# Altium footprint library Reflow3D1411sep.PcbLib: 657 footprints (part 11 of 42)
Each footprint in its own frame and in the unit in brackets; x right, y up, seen from the top. Pads: shape width x height; smd on the part's side, far side on the other; paste and mask are expansions set on the pad; w line width, h text height; cw(c..) or ccw(c..) is an arc to the next point about the centre after c.
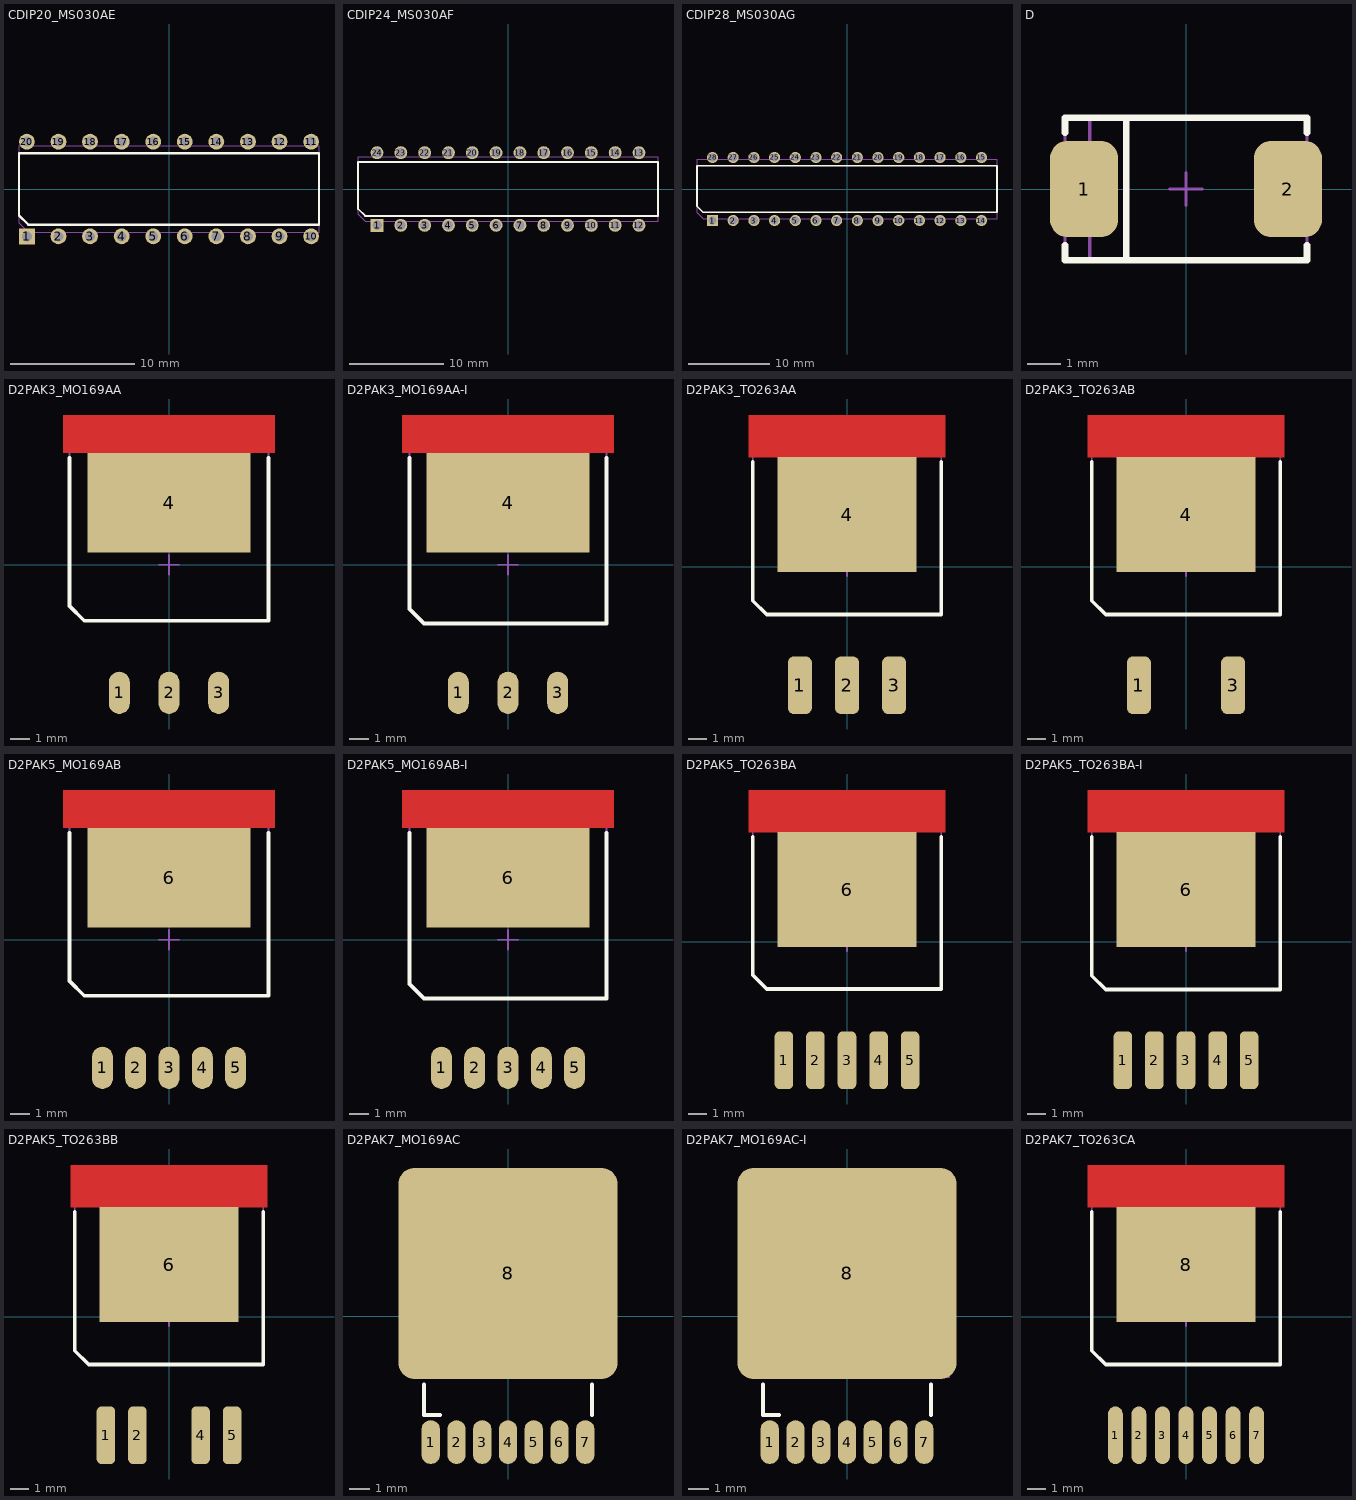
[diagram p10: the footprints below, top view; thin cyan lines are the x and y axes]

## CDIP20_MS030AE [mil] "www.ti.com, mcer002d.pdf, J20.asc"
height 177.56
pads (20):
  rect 50x50 hole 31: 1(-450,-150)
  round 50 hole 31: 2(-350,-150) 3(-250,-150) 4(-150,-150) 5(-50,-150) 6(50,-150) 7(150,-150) 8(250,-150) 9(350,-150) 10(450,-150) 11(450,150) 12(350,150) 13(250,150) 14(150,150) 15(50,150) 16(-50,150) 17(-150,150) 18(-250,150) 19(-350,150) 20(-450,150)
Top Overlay:
  lines w7.87: -475,-83.66 -445.47,-113.19 475,-113.19 475,113.19 -475,113.19 -475,-83.66
Mechanical 13:
  lines w3.94: -475,-106.69 -445.47,-136.22 475,-136.22 475,136.22 -475,136.22 -475,-106.69
3D body: height 200, standoff 0, extent -529.92,-150 529.92,150

## CDIP24_MS030AF [mm] "www.ti.com, mcer004a.pdf, JT24.asc"
height 4.51
pads (24):
  rect 1.37x1.37 hole 1.016: 1(-13.97,-3.875)
  round 1.37 hole 1.016: 2(-11.43,-3.875) 3(-8.89,-3.875) 4(-6.35,-3.875) 5(-3.81,-3.875) 6(-1.27,-3.875) 7(1.27,-3.875) 8(3.81,-3.875) 9(6.35,-3.875) 10(8.89,-3.875) 11(11.43,-3.875) 12(13.97,-3.875) 13(13.97,3.875) 14(11.43,3.875) 15(8.89,3.875) 16(6.35,3.875) 17(3.81,3.875) 18(1.27,3.875) 19(-1.27,3.875) 20(-3.81,3.875) 21(-6.35,3.875) 22(-8.89,3.875) 23(-11.43,3.875) 24(-13.97,3.875)
Top Overlay:
  lines w0.2: -16,-2.125 -15.25,-2.875 16,-2.875 16,2.875 -16,2.875 -16,-2.125
Mechanical 13:
  lines w0.1: -16,-2.71 -15.25,-3.46 16,-3.46 16,3.46 -16,3.46 -16,-2.71
3D body: height 5.08, standoff 0, extent -16.26,-3.81 16.26,3.81

## CDIP28_MS030AG [mm] "www.ti.com, mcer004a.pdf, JT28.asc"
height 4.51
pads (28):
  rect 1.37x1.37 hole 1.016: 1(-16.51,-3.875)
  round 1.37 hole 1.016: 2(-13.97,-3.875) 3(-11.43,-3.875) 4(-8.89,-3.875) 5(-6.35,-3.875) 6(-3.81,-3.875) 7(-1.27,-3.875) 8(1.27,-3.875) 9(3.81,-3.875) 10(6.35,-3.875) 11(8.89,-3.875) 12(11.43,-3.875) 13(13.97,-3.875) 14(16.51,-3.875) 15(16.51,3.875) 16(13.97,3.875) 17(11.43,3.875) 18(8.89,3.875) 19(6.35,3.875) 20(3.81,3.875) 21(1.27,3.875) 22(-1.27,3.875) 23(-3.81,3.875) 24(-6.35,3.875) 25(-8.89,3.875) 26(-11.43,3.875) 27(-13.97,3.875) 28(-16.51,3.875)
Top Overlay:
  lines w0.2: -18.415,-2.125 -18.415,2.875 18.415,2.875 18.415,-2.875 -17.665,-2.875 -18.415,-2.125
Mechanical 13:
  lines w0.1: -18.415,-2.91 -18.415,3.66 18.415,3.66 18.415,-3.66 -17.665,-3.66 -18.415,-2.91
3D body: height 5.08, standoff 0, extent -18.54,-3.695 18.54,3.695

## D [mm] "www.nec-tokin.com, capacitors.pdf"
height 2.8
pads (2):
  rrect50% 2.05x2.9 smd mask+0.075: 1(-3.075,0) 2(3.075,0)
Top Overlay:
  lines w0.2: -3.65,-1.7 -3.65,-2.15 3.65,-2.15 3.65,-1.7 ; -3.65,1.7 -3.65,2.15 3.65,2.15 3.65,1.7 ; -1.8,-2.15 -1.8,2.15
Mechanical 13:
  lines w0.1: -2.9,-2.15 -2.9,2.15 ; -3.65,-2.15 3.65,-2.15 3.65,2.15 -3.65,2.15 -3.65,-2.15
Mechanical 15:
  lines w0.1: -0.5,0 0.5,0 ; 0,-0.5 0,0.5
3D body: height 3, standoff 0, extent -3.75,-2.25 3.75,2.25

## D2PAK3_MO169AA [mm] "www.national.com, ts3b.pdf, AN-1797.pdf"
height 4.57
pads (4):
  oval 1.07x2.16 smd mask+0.075: 1(-2.54,-6.545) 2(0,-6.545) 3(2.54,-6.545)
  rect 8.33x5.08 smd paste-25.4 mask-25.4: 4(0,3.175)
Top Layer:
  region: -5.4,5.715 5.4,5.715 5.4,7.625 -5.4,7.625
Top Overlay:
  lines w0.2: -5.08,5.45 -5.08,-2.11 -4.33,-2.86 5.08,-2.86 5.08,5.45
Top Paste:
  region: 5.25,7.475 2.85,7.475 2.85,5.865 5.25,5.865
  region: 2.55,7.475 0.15,7.475 0.15,5.865 2.55,5.865
  region: -0.15,7.475 -2.55,7.475 -2.55,5.865 -0.15,5.865
  region: -2.85,7.475 -5.25,7.475 -5.25,5.865 -2.85,5.865
  region: -0.15,5.565 -4.015,5.565 -4.015,3.325 -0.15,3.325
  region: 4.015,5.565 0.15,5.565 0.15,3.325 4.015,3.325
  region: 4.015,3.025 0.15,3.025 0.15,0.785 4.015,0.785
  region: -0.15,3.025 -4.015,3.025 -4.015,0.785 -0.15,0.785
Top Solder:
  region: 4.24,0.56 4.24,5.64 5.475,5.64 5.475,7.7 -5.475,7.7 -5.475,5.64 -4.24,5.64 -4.24,0.56
Mechanical 13:
  lines w0.1: -5.08,-2.11 -5.08,5.78 5.08,5.78 5.08,-2.86 -4.33,-2.86 -5.08,-2.11
Mechanical 15:
  lines w0.1: -0.5,0 0.5,0 ; 0,-0.5 0,0.5
3D body: height 4.64, standoff 0, extent -5.205,-2.985 5.205,5.905

## D2PAK3_MO169AA-I [mm] "www.national.com, ts3b.pdf, AN-1797.pdf; www.jedec.org, MO-169B.pdf"
height 4.49
pads (4):
  oval 1.07x2.16 smd mask+0.075: 1(-2.54,-6.545) 2(0,-6.545) 3(2.54,-6.545)
  rect 8.33x5.08 smd paste-25.4 mask-25.4: 4(0,3.175)
Top Layer:
  region: -5.4,5.715 5.4,5.715 5.4,7.625 -5.4,7.625
Top Overlay:
  lines w0.2: -5.04,5.45 -5.04,-2.26 -4.29,-3.01 5.04,-3.01 5.04,5.45
Top Paste:
  region: 5.25,7.475 2.85,7.475 2.85,5.865 5.25,5.865
  region: 2.55,7.475 0.15,7.475 0.15,5.865 2.55,5.865
  region: -0.15,7.475 -2.55,7.475 -2.55,5.865 -0.15,5.865
  region: -2.85,7.475 -5.25,7.475 -5.25,5.865 -2.85,5.865
  region: -0.15,5.565 -4.015,5.565 -4.015,3.325 -0.15,3.325
  region: 4.015,5.565 0.15,5.565 0.15,3.325 4.015,3.325
  region: 4.015,3.025 0.15,3.025 0.15,0.785 4.015,0.785
  region: -0.15,3.025 -4.015,3.025 -4.015,0.785 -0.15,0.785
Top Solder:
  region: 4.24,0.56 4.24,5.64 5.475,5.64 5.475,7.7 -5.475,7.7 -5.475,5.64 -4.24,5.64 -4.24,0.56
Mechanical 13:
  lines w0.1: -5.04,-2.26 -5.04,5.88 5.04,5.88 5.04,-3.01 -4.29,-3.01 -5.04,-2.26
Mechanical 15:
  lines w0.1: -0.5,0 0.5,0 ; 0,-0.5 0,0.5
3D body: height 4.65, standoff 0, extent -5.205,-3.265 5.205,6.135

## D2PAK3_TO263AA [mm] "www.nxp.com, SOT404-REFLOW.pdf; www.ti.com, mpsf006d.pdf; www.jedec.org, TO-263E.pdf"
height 4.45
pads (4):
  rrect50% 1.3x3.1 smd paste-25.4 mask+0.075: 1(-2.54,-6.4) 2(0,-6.4) 3(2.54,-6.4)
  rect 7.5x6.2 smd paste-25.4 mask-25.4: 4(0,2.8)
Top Layer:
  region: -5.3,5.9 5.3,5.9 5.3,8.15 -5.3,8.15
Top Overlay:
  lines w0.2: -5.08,5.65 -5.08,-1.84 -4.33,-2.59 5.08,-2.59 5.08,5.65
Top Paste:
  region: -0.6,-6.5 -0.6,-7.9 0.6,-7.9 0.6,-6.5
  region: -0.6,-4.9 -0.6,-6.3 0.6,-6.3 0.6,-4.9
  region: -3.14,-6.5 -3.14,-7.9 -1.94,-7.9 -1.94,-6.5
  region: -3.14,-4.9 -3.14,-6.3 -1.94,-6.3 -1.94,-4.9
  region: 1.94,-4.9 1.94,-6.3 3.14,-6.3 3.14,-4.9
  region: 1.94,-6.5 1.94,-7.9 3.14,-7.9 3.14,-6.5
  region: -2,1.25 -3.7,1.25 -3.7,-0.25 -2,-0.25
  region: -3.75,5.95 -3.75,8.1 -5.25,8.1 -5.25,5.95
  region: -0.1,1.25 -1.8,1.25 -1.8,-0.25 -0.1,-0.25
  region: 3.7,1.25 2,1.25 2,-0.25 3.7,-0.25
  region: 1.8,1.25 0.1,1.25 0.1,-0.25 1.8,-0.25
  region: 1.8,4.35 0.1,4.35 0.1,2.85 1.8,2.85
  region: 3.7,4.35 2,4.35 2,2.85 3.7,2.85
  region: -0.1,4.35 -1.8,4.35 -1.8,2.85 -0.1,2.85
  region: -2,4.35 -3.7,4.35 -3.7,2.85 -2,2.85
  region: -1.95,5.95 -1.95,8.1 -3.45,8.1 -3.45,5.95
  region: -0.15,5.95 -0.15,8.1 -1.65,8.1 -1.65,5.95
  region: 5.25,5.95 5.25,8.1 3.75,8.1 3.75,5.95
  region: 3.45,5.95 3.45,8.1 1.95,8.1 1.95,5.95
  region: 1.65,5.95 1.65,8.1 0.15,8.1 0.15,5.95
Top Solder:
  region: 3.825,-0.375 3.825,5.825 5.375,5.825 5.375,8.225 -5.375,8.225 -5.375,5.825 -3.825,5.825 -3.825,-0.375
Mechanical 13:
  lines w0.1: -5.08,-1.84 -5.08,6.41 5.08,6.41 5.08,-2.59 -4.33,-2.59 -5.08,-1.84
Mechanical 15:
  lines w0.1: -0.5,0 0.5,0 ; 0,-0.5 0,0.5
3D body: height 4.83, standoff 0, extent -5.335,-2.915 5.335,6.735

## D2PAK3_TO263AB [mm] "www.nxp.com, SOT404-REFLOW.pdf; www.irf.com, po_d2pak.pdf; www.jedec.org, TO-263E.pdf"
height 4.45
pads (3):
  rrect50% 1.3x3.1 smd paste-25.4 mask+0.075: 1(-2.54,-6.4) 3(2.54,-6.4)
  rect 7.5x6.2 smd paste-25.4 mask-25.4: 4(0,2.8)
Top Layer:
  region: -5.3,5.9 5.3,5.9 5.3,8.15 -5.3,8.15
Top Overlay:
  lines w0.2: -5.08,5.65 -5.08,-1.84 -4.33,-2.59 5.08,-2.59 5.08,5.65
Top Paste:
  region: 1.65,5.95 1.65,8.1 0.15,8.1 0.15,5.95
  region: 3.45,5.95 3.45,8.1 1.95,8.1 1.95,5.95
  region: 5.25,5.95 5.25,8.1 3.75,8.1 3.75,5.95
  region: -0.15,5.95 -0.15,8.1 -1.65,8.1 -1.65,5.95
  region: -1.95,5.95 -1.95,8.1 -3.45,8.1 -3.45,5.95
  region: -2,4.35 -3.7,4.35 -3.7,2.85 -2,2.85
  region: -0.1,4.35 -1.8,4.35 -1.8,2.85 -0.1,2.85
  region: 3.7,4.35 2,4.35 2,2.85 3.7,2.85
  region: 1.8,4.35 0.1,4.35 0.1,2.85 1.8,2.85
  region: 1.8,1.25 0.1,1.25 0.1,-0.25 1.8,-0.25
  region: 3.7,1.25 2,1.25 2,-0.25 3.7,-0.25
  region: -0.1,1.25 -1.8,1.25 -1.8,-0.25 -0.1,-0.25
  region: -3.75,5.95 -3.75,8.1 -5.25,8.1 -5.25,5.95
  region: -2,1.25 -3.7,1.25 -3.7,-0.25 -2,-0.25
  region: 1.94,-6.5 1.94,-7.9 3.14,-7.9 3.14,-6.5
  region: 1.94,-4.9 1.94,-6.3 3.14,-6.3 3.14,-4.9
  region: -3.14,-4.9 -3.14,-6.3 -1.94,-6.3 -1.94,-4.9
  region: -3.14,-6.5 -3.14,-7.9 -1.94,-7.9 -1.94,-6.5
Top Solder:
  region: 3.825,-0.375 3.825,5.825 5.375,5.825 5.375,8.225 -5.375,8.225 -5.375,5.825 -3.825,5.825 -3.825,-0.375
Mechanical 13:
  lines w0.1: -5.08,-1.84 -4.33,-2.59 5.08,-2.59 5.08,6.41 -5.08,6.41 -5.08,-1.84
Mechanical 15:
  lines w0.1: -0.5,0 0.5,0 ; 0,-0.5 0,0.5
3D body: height 4.83, standoff 0, extent -5.335,-2.915 5.335,6.735

## D2PAK5_MO169AB [mm] "www.national.com, ts5b.pdf, AN-1797.pdf"
height 4.57
pads (6):
  oval 1.07x2.16 smd mask+0.075: 1(-3.4,-6.545) 2(-1.7,-6.545) 3(0,-6.545) 4(1.7,-6.545) 5(3.4,-6.545)
  rect 8.33x5.08 smd paste-25.4 mask-25.4: 6(0,3.175)
Top Layer:
  region: -5.4,5.715 5.4,5.715 5.4,7.625 -5.4,7.625
Top Overlay:
  lines w0.2: -5.08,5.45 -5.08,-2.11 -4.33,-2.86 5.08,-2.86 5.08,5.45
Top Paste:
  region: 5.25,7.475 2.85,7.475 2.85,5.865 5.25,5.865
  region: 2.55,7.475 0.15,7.475 0.15,5.865 2.55,5.865
  region: -0.15,7.475 -2.55,7.475 -2.55,5.865 -0.15,5.865
  region: -2.85,7.475 -5.25,7.475 -5.25,5.865 -2.85,5.865
  region: -0.15,5.565 -4.015,5.565 -4.015,3.325 -0.15,3.325
  region: 4.015,5.565 0.15,5.565 0.15,3.325 4.015,3.325
  region: 4.015,3.025 0.15,3.025 0.15,0.785 4.015,0.785
  region: -0.15,3.025 -4.015,3.025 -4.015,0.785 -0.15,0.785
Top Solder:
  region: 4.24,0.56 4.24,5.64 5.475,5.64 5.475,7.7 -5.475,7.7 -5.475,5.64 -4.24,5.64 -4.24,0.56
Mechanical 13:
  lines w0.1: -5.08,-2.11 -5.08,5.78 5.08,5.78 5.08,-2.86 -4.33,-2.86 -5.08,-2.11
Mechanical 15:
  lines w0.1: -0.5,0 0.5,0 ; 0,-0.5 0,0.5
3D body: height 4.65, standoff 0, extent -5.205,-2.985 5.205,5.905

## D2PAK5_MO169AB-I [mm] "www.national.com, ts5b.pdf, AN-1797.pdf; www.jedec.org, MO-169B.pdf"
height 4.49
pads (6):
  oval 1.07x2.16 smd mask+0.075: 1(-3.4,-6.545) 2(-1.7,-6.545) 3(0,-6.545) 4(1.7,-6.545) 5(3.4,-6.545)
  rect 8.33x5.08 smd paste-25.4 mask-25.4: 6(0,3.175)
Top Layer:
  region: -5.4,5.715 5.4,5.715 5.4,7.625 -5.4,7.625
Top Overlay:
  lines w0.2: -5.04,5.45 -5.04,-2.26 -4.29,-3.01 5.04,-3.01 5.04,5.45
Top Paste:
  region: -0.15,3.025 -4.015,3.025 -4.015,0.785 -0.15,0.785
  region: 4.015,3.025 0.15,3.025 0.15,0.785 4.015,0.785
  region: 4.015,5.565 0.15,5.565 0.15,3.325 4.015,3.325
  region: -0.15,5.565 -4.015,5.565 -4.015,3.325 -0.15,3.325
  region: -2.85,7.475 -5.25,7.475 -5.25,5.865 -2.85,5.865
  region: -0.15,7.475 -2.55,7.475 -2.55,5.865 -0.15,5.865
  region: 2.55,7.475 0.15,7.475 0.15,5.865 2.55,5.865
  region: 5.25,7.475 2.85,7.475 2.85,5.865 5.25,5.865
Top Solder:
  region: 4.24,0.56 4.24,5.64 5.475,5.64 5.475,7.7 -5.475,7.7 -5.475,5.64 -4.24,5.64 -4.24,0.56
Mechanical 13:
  lines w0.1: -5.04,-2.26 -4.29,-3.01 5.04,-3.01 5.04,5.88 -5.04,5.88 -5.04,-2.26
Mechanical 15:
  lines w0.1: -0.5,0 0.5,0 ; 0,-0.5 0,0.5
3D body: height 4.65, standoff 0, extent -5.205,-3.265 5.205,6.135

## D2PAK5_TO263BA [mm] "www.nxp.com, SOT426_fr.pdf; www.ti.com, mpsf007d.pdf"
height 4.45
pads (6):
  rrect50% 1x3.1 smd paste-25.4 mask+0.075: 1(-3.4,-6.4) 2(-1.7,-6.4) 3(0,-6.4) 4(1.7,-6.4) 5(3.4,-6.4)
  rect 7.5x6.2 smd paste-25.4 mask-25.4: 6(0,2.8)
Top Layer:
  region: -5.3,5.9 5.3,5.9 5.3,8.15 -5.3,8.15
Top Overlay:
  lines w0.2: -5.08,5.65 -5.08,-1.805 -4.33,-2.555 5.08,-2.555 5.08,5.65
Top Paste:
  region: 2.96,-6.5 2.96,-7.9 3.86,-7.9 3.86,-6.5
  region: 2.96,-4.9 2.96,-6.3 3.86,-6.3 3.86,-4.9
  region: 1.26,-6.5 1.26,-7.9 2.16,-7.9 2.16,-6.5
  region: 1.26,-4.9 1.26,-6.3 2.16,-6.3 2.16,-4.9
  region: -2.14,-6.5 -2.14,-7.9 -1.24,-7.9 -1.24,-6.5
  region: -2.14,-4.9 -2.14,-6.3 -1.24,-6.3 -1.24,-4.9
  region: 1.65,5.95 1.65,8.1 0.15,8.1 0.15,5.95
  region: 3.45,5.95 3.45,8.1 1.95,8.1 1.95,5.95
  region: 5.25,5.95 5.25,8.1 3.75,8.1 3.75,5.95
  region: -0.15,5.95 -0.15,8.1 -1.65,8.1 -1.65,5.95
  region: -1.95,5.95 -1.95,8.1 -3.45,8.1 -3.45,5.95
  region: -2,4.35 -3.7,4.35 -3.7,2.85 -2,2.85
  region: -0.1,4.35 -1.8,4.35 -1.8,2.85 -0.1,2.85
  region: 3.7,4.35 2,4.35 2,2.85 3.7,2.85
  region: 1.8,4.35 0.1,4.35 0.1,2.85 1.8,2.85
  region: 1.8,1.25 0.1,1.25 0.1,-0.25 1.8,-0.25
  region: 3.7,1.25 2,1.25 2,-0.25 3.7,-0.25
  region: -0.1,1.25 -1.8,1.25 -1.8,-0.25 -0.1,-0.25
  region: -3.75,5.95 -3.75,8.1 -5.25,8.1 -5.25,5.95
  region: -2,1.25 -3.7,1.25 -3.7,-0.25 -2,-0.25
  region: -3.85,-4.9 -3.85,-6.3 -2.95,-6.3 -2.95,-4.9
  region: -3.85,-6.5 -3.85,-7.9 -2.95,-7.9 -2.95,-6.5
  region: -0.44,-4.9 -0.44,-6.3 0.46,-6.3 0.46,-4.9
  region: -0.44,-6.5 -0.44,-7.9 0.46,-7.9 0.46,-6.5
Top Solder:
  region: 3.825,-0.375 3.825,5.825 5.375,5.825 5.375,8.225 -5.375,8.225 -5.375,5.825 -3.825,5.825 -3.825,-0.375
Mechanical 13:
  lines w0.1: -5.08,-1.805 -4.33,-2.555 5.08,-2.555 5.08,6.375 -5.08,6.375 -5.08,-1.805
Mechanical 15:
  lines w0.1: -0.5,0 0.5,0 ; 0,-0.5 0,0.5
3D body: height 4.83, standoff 0, extent -5.335,-2.915 5.335,6.735

## D2PAK5_TO263BA-I [mm] "www.nxp.com, SOT426_fr.pdf; www.jedec.org, TO-263E.pdf"
height 4.45
pads (6):
  rrect50% 1x3.1 smd paste-25.4 mask+0.075: 1(-3.4,-6.4) 2(-1.7,-6.4) 3(0,-6.4) 4(1.7,-6.4) 5(3.4,-6.4)
  rect 7.5x6.2 smd paste-25.4 mask-25.4: 6(0,2.8)
Top Layer:
  region: -5.3,5.9 5.3,5.9 5.3,8.15 -5.3,8.15
Top Overlay:
  lines w0.2: -5.08,5.65 -5.08,-1.84 -4.33,-2.59 5.08,-2.59 5.08,5.65
Top Paste:
  region: 2.96,-6.5 2.96,-7.9 3.86,-7.9 3.86,-6.5
  region: 2.96,-4.9 2.96,-6.3 3.86,-6.3 3.86,-4.9
  region: 1.26,-6.5 1.26,-7.9 2.16,-7.9 2.16,-6.5
  region: 1.26,-4.9 1.26,-6.3 2.16,-6.3 2.16,-4.9
  region: -2.14,-6.5 -2.14,-7.9 -1.24,-7.9 -1.24,-6.5
  region: -2.14,-4.9 -2.14,-6.3 -1.24,-6.3 -1.24,-4.9
  region: 1.65,5.95 1.65,8.1 0.15,8.1 0.15,5.95
  region: 3.45,5.95 3.45,8.1 1.95,8.1 1.95,5.95
  region: 5.25,5.95 5.25,8.1 3.75,8.1 3.75,5.95
  region: -0.15,5.95 -0.15,8.1 -1.65,8.1 -1.65,5.95
  region: -1.95,5.95 -1.95,8.1 -3.45,8.1 -3.45,5.95
  region: -2,4.35 -3.7,4.35 -3.7,2.85 -2,2.85
  region: -0.1,4.35 -1.8,4.35 -1.8,2.85 -0.1,2.85
  region: 3.7,4.35 2,4.35 2,2.85 3.7,2.85
  region: 1.8,4.35 0.1,4.35 0.1,2.85 1.8,2.85
  region: 1.8,1.25 0.1,1.25 0.1,-0.25 1.8,-0.25
  region: 3.7,1.25 2,1.25 2,-0.25 3.7,-0.25
  region: -0.1,1.25 -1.8,1.25 -1.8,-0.25 -0.1,-0.25
  region: -3.75,5.95 -3.75,8.1 -5.25,8.1 -5.25,5.95
  region: -2,1.25 -3.7,1.25 -3.7,-0.25 -2,-0.25
  region: -3.85,-4.9 -3.85,-6.3 -2.95,-6.3 -2.95,-4.9
  region: -3.85,-6.5 -3.85,-7.9 -2.95,-7.9 -2.95,-6.5
  region: -0.44,-4.9 -0.44,-6.3 0.46,-6.3 0.46,-4.9
  region: -0.44,-6.5 -0.44,-7.9 0.46,-7.9 0.46,-6.5
Top Solder:
  region: 3.825,-0.375 3.825,5.825 5.375,5.825 5.375,8.225 -5.375,8.225 -5.375,5.825 -3.825,5.825 -3.825,-0.375
Mechanical 13:
  lines w0.1: -5.08,-1.84 -5.08,6.41 5.08,6.41 5.08,-2.59 -4.33,-2.59 -5.08,-1.84
Mechanical 15:
  lines w0.1: -0.5,0 0.5,0 ; 0,-0.5 0,0.5
3D body: height 4.83, standoff 0, extent -5.335,-2.915 5.335,6.735

## D2PAK5_TO263BB [mm] "www.nxp.com, SOT426_fr.pdf; www.irf.com, po_d2pak-5l.pdf; www.jedec.org, TO-263E.pdf"
height 4.45
pads (5):
  rrect50% 1x3.1 smd paste-25.4 mask+0.075: 1(-3.4,-6.4) 2(-1.7,-6.4) 4(1.7,-6.4) 5(3.4,-6.4)
  rect 7.5x6.2 smd paste-25.4 mask-25.4: 6(0,2.8)
Top Layer:
  region: -5.3,5.9 5.3,5.9 5.3,8.15 -5.3,8.15
Top Overlay:
  lines w0.2: -5.08,5.65 -5.08,-1.84 -4.33,-2.59 5.08,-2.59 5.08,5.65
Top Paste:
  region: -3.85,-6.5 -3.85,-7.9 -2.95,-7.9 -2.95,-6.5
  region: -3.85,-4.9 -3.85,-6.3 -2.95,-6.3 -2.95,-4.9
  region: -2,1.25 -3.7,1.25 -3.7,-0.25 -2,-0.25
  region: -3.75,5.95 -3.75,8.1 -5.25,8.1 -5.25,5.95
  region: -0.1,1.25 -1.8,1.25 -1.8,-0.25 -0.1,-0.25
  region: 3.7,1.25 2,1.25 2,-0.25 3.7,-0.25
  region: 1.8,1.25 0.1,1.25 0.1,-0.25 1.8,-0.25
  region: 1.8,4.35 0.1,4.35 0.1,2.85 1.8,2.85
  region: 3.7,4.35 2,4.35 2,2.85 3.7,2.85
  region: -0.1,4.35 -1.8,4.35 -1.8,2.85 -0.1,2.85
  region: -2,4.35 -3.7,4.35 -3.7,2.85 -2,2.85
  region: -1.95,5.95 -1.95,8.1 -3.45,8.1 -3.45,5.95
  region: -0.15,5.95 -0.15,8.1 -1.65,8.1 -1.65,5.95
  region: 5.25,5.95 5.25,8.1 3.75,8.1 3.75,5.95
  region: 3.45,5.95 3.45,8.1 1.95,8.1 1.95,5.95
  region: 1.65,5.95 1.65,8.1 0.15,8.1 0.15,5.95
  region: -2.14,-4.9 -2.14,-6.3 -1.24,-6.3 -1.24,-4.9
  region: -2.14,-6.5 -2.14,-7.9 -1.24,-7.9 -1.24,-6.5
  region: 1.26,-4.9 1.26,-6.3 2.16,-6.3 2.16,-4.9
  region: 1.26,-6.5 1.26,-7.9 2.16,-7.9 2.16,-6.5
  region: 2.96,-4.9 2.96,-6.3 3.86,-6.3 3.86,-4.9
  region: 2.96,-6.5 2.96,-7.9 3.86,-7.9 3.86,-6.5
Top Solder:
  region: 3.825,-0.375 3.825,5.825 5.375,5.825 5.375,8.225 -5.375,8.225 -5.375,5.825 -3.825,5.825 -3.825,-0.375
Mechanical 13:
  lines w0.1: -5.08,-1.84 -4.33,-2.59 5.08,-2.59 5.08,6.41 -5.08,6.41 -5.08,-1.84
Mechanical 15:
  lines w0.1: -0.5,0 0.5,0 ; 0,-0.5 0,0.5
3D body: height 4.83, standoff 0, extent -5.335,-2.915 5.335,6.735

## D2PAK7_MO169AC [mm] "www.national.com, ts7b.pdf, AN-1797.pdf"
height 4.57
pads (8):
  oval 0.91x2.16 smd mask+0.075: 1(-3.81,-6.22) 2(-2.54,-6.22) 3(-1.27,-6.22) 4(0,-6.22) 5(1.27,-6.22) 6(2.54,-6.22) 7(3.81,-6.22)
  rrect15% 10.8x10.41 smd paste-25.4 mask+0.075: 8(0,2.1)
Top Overlay:
  lines w0.2: -4.15,-3.37 -4.15,-4.875 -3.35,-4.875 ; 4.15,-4.875 4.15,-3.37
Top Paste:
  region: -1.95,7.155 -5.25,7.155 -5.25,3.985 -1.95,3.985
  region: 1.65,7.155 -1.65,7.155 -1.65,3.985 1.65,3.985
  region: 5.25,7.155 1.95,7.155 1.95,3.985 5.25,3.985
  region: -1.95,3.685 -5.25,3.685 -5.25,0.515 -1.95,0.515
  region: 1.65,3.685 -1.65,3.685 -1.65,0.515 1.65,0.515
  region: 5.25,3.685 1.95,3.685 1.95,0.515 5.25,0.515
  region: 5.25,0.215 1.95,0.215 1.95,-2.955 5.25,-2.955
  region: 1.65,0.215 -1.65,0.215 -1.65,-2.955 1.65,-2.955
  region: -1.95,0.215 -5.25,0.215 -5.25,-2.955 -1.95,-2.955
Mechanical 13:
  lines w0.1: -5.08,-2.11 -5.08,5.78 5.08,5.78 5.08,-2.86 -4.33,-2.86 -5.08,-2.11
Mechanical 15:
  lines w0.1: -0.5,0 0.5,0 ; 0,-0.5 0,0.5
3D body: height 4.64, standoff 0, extent -5.205,-2.985 5.205,5.905

## D2PAK7_MO169AC-I [mm] "www.national.com, ts7b.pdf, AN-1797.pdf; www.jedec.org, MO-169B.pdf"
height 4.49
pads (8):
  oval 0.91x2.16 smd mask+0.075: 1(-3.81,-6.22) 2(-2.54,-6.22) 3(-1.27,-6.22) 4(0,-6.22) 5(1.27,-6.22) 6(2.54,-6.22) 7(3.81,-6.22)
  rrect15% 10.8x10.41 smd paste-25.4 mask+0.075: 8(0,2.1)
Top Overlay:
  lines w0.2: -4.15,-3.37 -4.15,-4.875 -3.35,-4.875 ; 4.15,-4.875 4.15,-3.37
Top Paste:
  region: -1.95,0.215 -5.25,0.215 -5.25,-2.955 -1.95,-2.955
  region: 1.65,0.215 -1.65,0.215 -1.65,-2.955 1.65,-2.955
  region: 5.25,0.215 1.95,0.215 1.95,-2.955 5.25,-2.955
  region: 5.25,3.685 1.95,3.685 1.95,0.515 5.25,0.515
  region: 1.65,3.685 -1.65,3.685 -1.65,0.515 1.65,0.515
  region: -1.95,3.685 -5.25,3.685 -5.25,0.515 -1.95,0.515
  region: 5.25,7.155 1.95,7.155 1.95,3.985 5.25,3.985
  region: 1.65,7.155 -1.65,7.155 -1.65,3.985 1.65,3.985
  region: -1.95,7.155 -5.25,7.155 -5.25,3.985 -1.95,3.985
Mechanical 13:
  lines w0.1: -5.04,-2.26 -5.04,5.88 5.04,5.88 5.04,-3.01 -4.29,-3.01 -5.04,-2.26
Mechanical 15:
  lines w0.1: -0.5,0 0.5,0 ; 0,-0.5 0,0.5
3D body: height 4.65, standoff 0, extent -5.205,-3.265 5.205,6.135

## D2PAK7_TO263CA [mm] "www.nxp.com, SOT427-REFLOW.pdf; www.jedec.org, TO-263E.pdf"
height 4.45
pads (8):
  oval 0.8x3.1 smd paste-25.4 mask+0.075: 1(-3.81,-6.4) 2(-2.54,-6.4) 3(-1.27,-6.4) 4(0,-6.4) 5(1.27,-6.4) 6(2.54,-6.4) 7(3.81,-6.4)
  rect 7.5x6.2 smd paste-25.4 mask-25.4: 8(0,2.8)
Top Layer:
  region: -5.3,5.9 5.3,5.9 5.3,8.15 -5.3,8.15
Top Overlay:
  lines w0.2: -5.08,5.65 -5.08,-1.84 -4.33,-2.59 5.08,-2.59 5.08,5.65
Top Paste:
  region: -4.16,-6.5 -4.16,-7.9 -3.46,-7.9 -3.46,-6.5
  region: -4.16,-4.9 -4.16,-6.3 -3.46,-6.3 -3.46,-4.9
  region: -2,1.25 -3.7,1.25 -3.7,-0.25 -2,-0.25
  region: -3.75,5.95 -3.75,8.1 -5.25,8.1 -5.25,5.95
  region: -0.1,1.25 -1.8,1.25 -1.8,-0.25 -0.1,-0.25
  region: 3.7,1.25 2,1.25 2,-0.25 3.7,-0.25
  region: 1.8,1.25 0.1,1.25 0.1,-0.25 1.8,-0.25
  region: 1.8,4.35 0.1,4.35 0.1,2.85 1.8,2.85
  region: 3.7,4.35 2,4.35 2,2.85 3.7,2.85
  region: -0.1,4.35 -1.8,4.35 -1.8,2.85 -0.1,2.85
  region: -2,4.35 -3.7,4.35 -3.7,2.85 -2,2.85
  region: -1.95,5.95 -1.95,8.1 -3.45,8.1 -3.45,5.95
  region: -0.15,5.95 -0.15,8.1 -1.65,8.1 -1.65,5.95
  region: 5.25,5.95 5.25,8.1 3.75,8.1 3.75,5.95
  region: 3.45,5.95 3.45,8.1 1.95,8.1 1.95,5.95
  region: 1.65,5.95 1.65,8.1 0.15,8.1 0.15,5.95
  region: -2.89,-4.9 -2.89,-6.3 -2.19,-6.3 -2.19,-4.9
  region: -2.89,-6.5 -2.89,-7.9 -2.19,-7.9 -2.19,-6.5
  region: -1.62,-4.9 -1.62,-6.3 -0.92,-6.3 -0.92,-4.9
  region: -1.62,-6.5 -1.62,-7.9 -0.92,-7.9 -0.92,-6.5
  region: 0.92,-4.9 0.92,-6.3 1.62,-6.3 1.62,-4.9
  region: 0.92,-6.5 0.92,-7.9 1.62,-7.9 1.62,-6.5
  region: 2.19,-4.9 2.19,-6.3 2.89,-6.3 2.89,-4.9
  region: 2.19,-6.5 2.19,-7.9 2.89,-7.9 2.89,-6.5
  region: 3.46,-4.9 3.46,-6.3 4.16,-6.3 4.16,-4.9
  region: 3.46,-6.5 3.46,-7.9 4.16,-7.9 4.16,-6.5
  region: -0.35,-6.5 -0.35,-7.9 0.35,-7.9 0.35,-6.5
  region: -0.35,-4.9 -0.35,-6.3 0.35,-6.3 0.35,-4.9
Top Solder:
  region: 3.825,-0.375 3.825,5.825 5.375,5.825 5.375,8.225 -5.375,8.225 -5.375,5.825 -3.825,5.825 -3.825,-0.375
Mechanical 13:
  lines w0.1: -5.08,-1.84 -4.33,-2.59 5.08,-2.59 5.08,6.41 -5.08,6.41 -5.08,-1.84
Mechanical 15:
  lines w0.1: -0.5,0 0.5,0 ; 0,-0.5 0,0.5
3D body: height 4.83, standoff 0, extent -5.335,-2.915 5.335,6.735